# Altium footprint library shkb_lib.PcbLib: 50 footprints (part 4 of 4)
Each footprint in its own frame and in the unit in brackets; x right, y up, seen from the top. Pads: shape width x height; smd on the part's side, far side on the other; paste and mask are expansions set on the pad; w line width, h text height; cw(c..) or ccw(c..) is an arc to the next point about the centre after c.
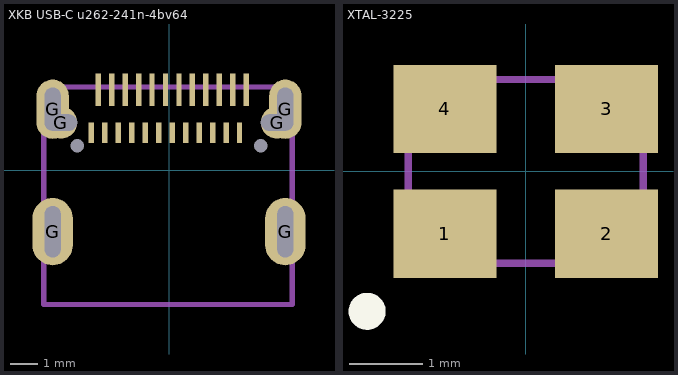
[diagram p3: the footprints below, top view; thin cyan lines are the x and y axes]

## XKB USB-C u262-241n-4bv64 [mm]
pads (32):
  rect 0.2x1.2 smd: A1(-2.63,3) A2(-2.13,3) A3(-1.63,3) A4(-1.13,3) A5(-0.63,3) A6(-0.13,3) A7(0.37,3) A8(0.87,3) A9(1.37,3) A10(1.87,3) A11(2.37,3) A12(2.87,3)
  rect 0.2x0.75 smd: B1(2.62,1.4) B2(2.12,1.4) B3(1.62,1.4) B4(1.12,1.4) B5(0.62,1.4) B6(0.12,1.4) B7(-0.38,1.4) B8(-0.88,1.4) B9(-1.38,1.4) B10(-1.88,1.4) B11(-2.38,1.4) B12(-2.88,1.4)
  oval 1.5x2.5 hole 0.6 slot 1.9 at 90 deg: G(-4.32,-2.275) G(4.32,-2.275)
  oval 1.2x2.2 hole 0.6 slot 1.6 at 90 deg: G(-4.32,2.275) G(4.32,2.275)
  round 1.2 hole 0.6 slot 1.2 at 0 deg: G(-4.013,1.778) G(4.013,1.778)
  round 0 hole 0.5 unplated: ""(-3.4,0.925) ""(3.4,0.925)
Mechanical 13:
  lines w0.2: -4.648,-4.978 4.572,-4.978 4.572,3.099 -4.648,3.099 -4.648,-4.978
  text ".Designator" at -3.048,-0.737 h0.5
3D body "u262-241n-4bv64.stp": height 3.35, standoff -0.45, extent -4.63,-4.976 4.63,3.124

## XTAL-3225 [mm]
pads (4):
  rect 1.4x1.2 smd: 1(-1.1,-0.85) 2(1.1,-0.85) 3(1.1,0.85) 4(-1.1,0.85)
Top Overlay:
  circle w0.254: c-2.159,-1.905 r0.125
Mechanical 13:
  lines w0.1: -1.6,-1.25 1.6,-1.25 1.6,1.25 -1.6,1.25 -1.6,-1.25
  text ".Designator" at -1.397,-0.127 h0.35
3D body "3225 SMD Crystal Oscillator.STEP": height 0.65, standoff -0.05, extent -1.6,-1.25 1.6,1.25